# Altium footprint library BeaconBoard.PcbLib: 39 footprints (part 1 of 3)
Each footprint in its own frame and in the unit in brackets; x right, y up, seen from the top. Pads: shape width x height; smd on the part's side, far side on the other; paste and mask are expansions set on the pad; w line width, h text height; cw(c..) or ccw(c..) is an arc to the next point about the centre after c.
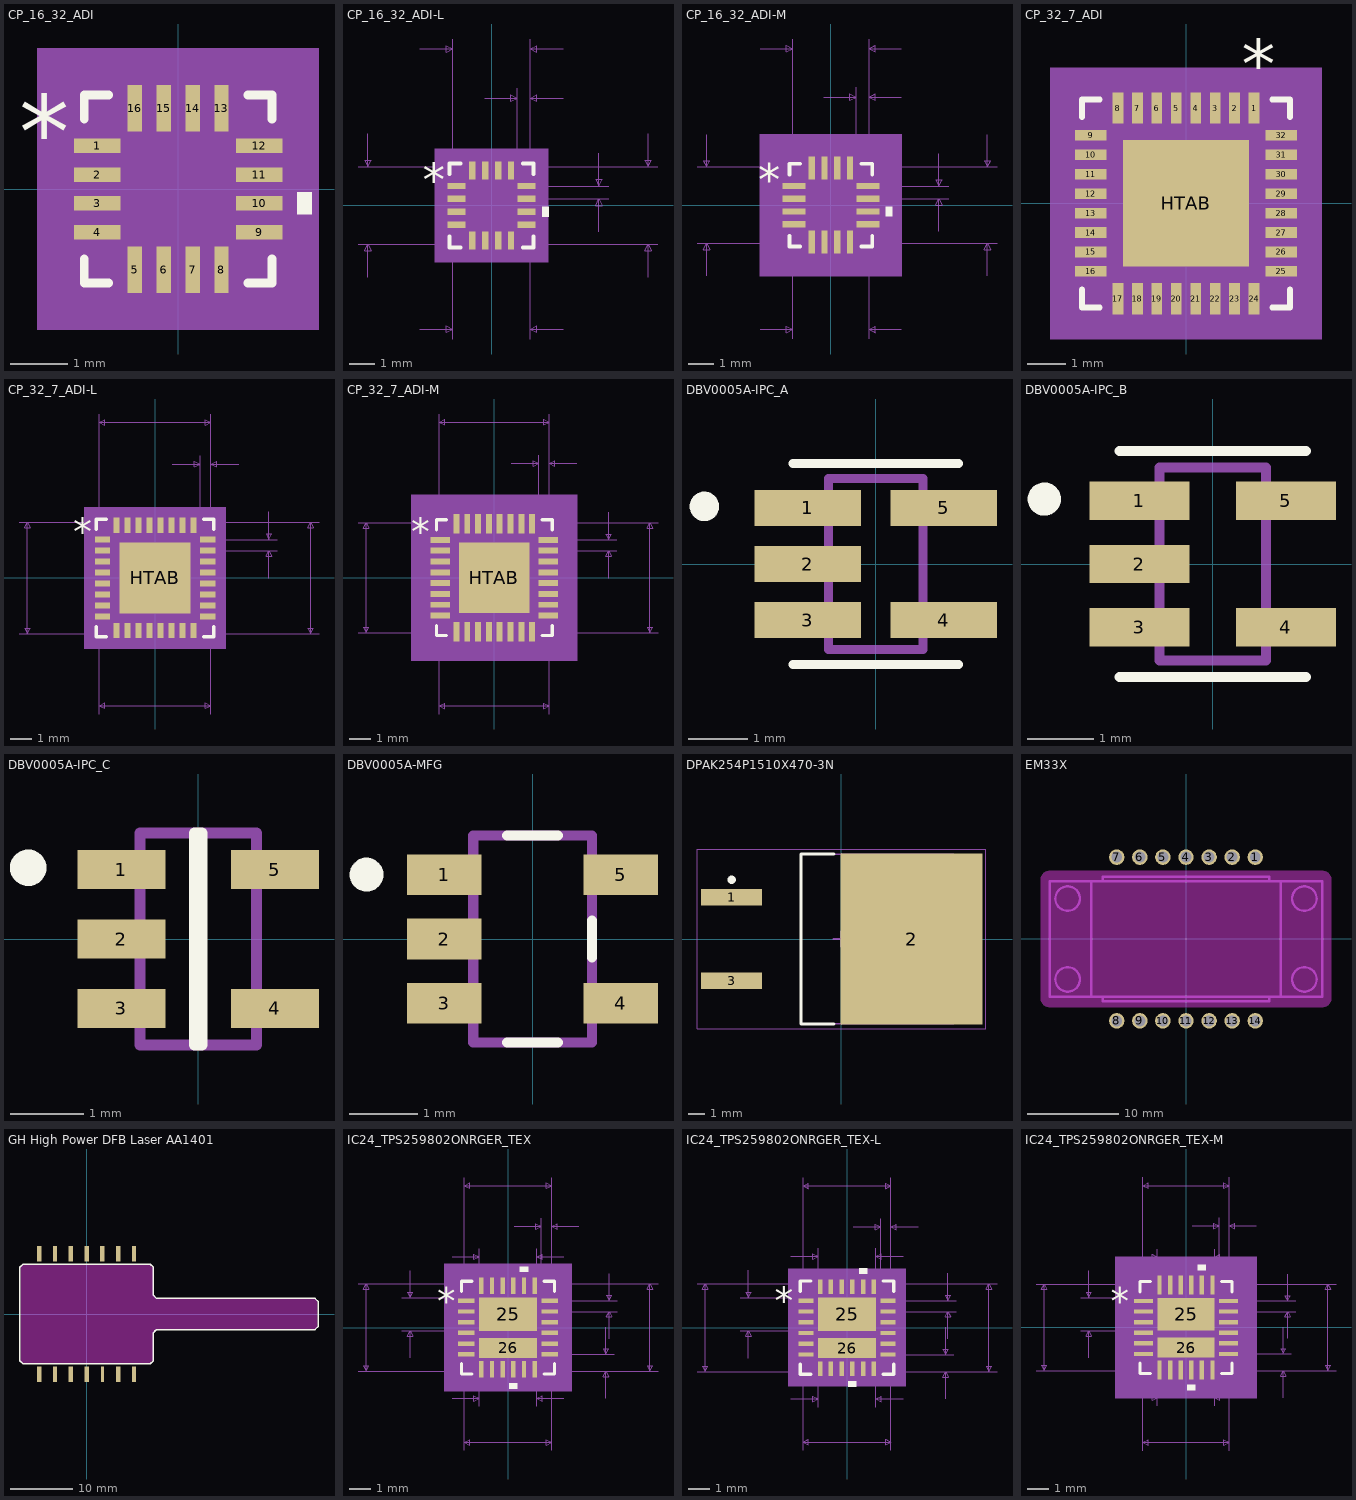
[diagram p0: the footprints below, top view; thin cyan lines are the x and y axes]

## CP_16_32_ADI [mm]
pads (16):
  rect 0.805x0.249 smd paste+0 mask+0: 1(-1.402,0.75) 2(-1.402,0.25) 3(-1.402,-0.25) 4(-1.402,-0.75) 9(1.402,-0.75) 10(1.402,-0.25) 11(1.402,0.25) 12(1.402,0.75)
  rect 0.249x0.805 smd paste+0 mask+0: 5(-0.75,-1.402) 6(-0.25,-1.402) 7(0.25,-1.402) 8(0.75,-1.402) 13(0.75,1.402) 14(0.25,1.402) 15(-0.25,1.402) 16(-0.75,1.402)
Top Overlay:
  region: 2.059,-0.059 2.313,-0.059 2.313,-0.44 2.059,-0.44
  lines w0.152: -1.627,-1.207 -1.627,-1.627 -1.207,-1.627 ; -1.627,1.207 -1.627,1.627 -1.207,1.627 ; 1.207,-1.627 1.627,-1.627 1.627,-1.207 ; 1.207,1.627 1.627,1.627 1.627,1.207
  text "*" at -2.757,0.365 h1.27
Mechanical 5:
  region: 2.44,-2.44 -2.44,-2.44 -2.44,2.44 2.44,2.44
Mechanical 13:
  lines w0.025: -1.5,0.23 -0.23,1.5 ; -1.5,-1.5 1.5,-1.5 1.5,1.5 -1.5,1.5 -1.5,-1.5 ; -1.5,-0.9 -1.5,-0.6 -1.5,-0.9 ; -1.5,-0.4 -1.5,-0.1 -1.5,-0.4 ; -1.5,0.1 -1.5,0.4 -1.5,0.1 ; -1.5,0.6 -1.5,0.9 -1.5,0.6 ; -0.9,-1.5 -0.6,-1.5 -0.9,-1.5 ; -0.9,1.5 -0.6,1.5 -0.9,1.5 ; -0.4,-1.5 -0.1,-1.5 -0.4,-1.5 ; -0.4,1.5 -0.1,1.5 -0.4,1.5 ; 0.1,-1.5 0.4,-1.5 0.1,-1.5 ; 0.1,1.5 0.4,1.5 0.1,1.5 ; 0.6,-1.5 0.9,-1.5 0.6,-1.5 ; 0.6,1.5 0.9,1.5 0.6,1.5 ; 1.5,-0.9 1.5,-0.6 1.5,-0.9 ; 1.5,-0.4 1.5,-0.1 1.5,-0.4 ; 1.5,0.1 1.5,0.4 1.5,0.1 ; 1.5,0.6 1.5,0.9 1.5,0.6
  text "*" at -1.318,0.365 h1.27
Mechanical 15:
  region: -1.129,-1.754 -1.754,-1.754 -1.754,-1.129 -2.059,-1.129 -2.059,1.129 -1.754,1.129 -1.754,1.754 -1.129,1.754 -1.129,2.059 1.129,2.059 1.129,1.754 1.754,1.754 1.754,1.129 2.059,1.129 2.059,-1.129 1.754,-1.129 1.754,-1.754 1.129,-1.754 1.129,-2.059 -1.129,-2.059
  lines w0.152: -2.059,-1.129 -1.754,-1.129 -1.754,-1.754 -1.129,-1.754 -1.129,-2.059 1.129,-2.059 1.129,-1.754 1.754,-1.754 1.754,-1.129 2.059,-1.129 2.059,1.129 1.754,1.129 1.754,1.754 1.129,1.754 1.129,2.059 -1.129,2.059 -1.129,1.754 -1.754,1.754 -1.754,1.129 -2.059,1.129 -2.059,-1.129
3D body: height 0.25, standoff 0, extent 0,0 0.254,0.254
3D body "CP_16_32_ADI.step": height 0.89, standoff 0, extent -1.5,-1.5 1.5,1.5

## CP_16_32_ADI-L [mm]
pads (16):
  rect 0.703x0.249 smd paste+0 mask+0: 1(-1.352,0.75) 2(-1.352,0.25) 3(-1.352,-0.25) 4(-1.352,-0.75) 9(1.352,-0.75) 10(1.352,-0.25) 11(1.352,0.25) 12(1.352,0.75)
  rect 0.249x0.703 smd paste+0 mask+0: 5(-0.75,-1.352) 6(-0.25,-1.352) 7(0.25,-1.352) 8(0.75,-1.352) 13(0.75,1.352) 14(0.25,1.352) 15(-0.25,1.352) 16(-0.75,1.352)
Top Overlay:
  region: 1.957,-0.059 2.211,-0.059 2.211,-0.44 1.957,-0.44
  lines w0.152: -1.627,-1.207 -1.627,-1.627 -1.207,-1.627 ; -1.627,1.207 -1.627,1.627 -1.207,1.627 ; 1.207,-1.627 1.627,-1.627 1.627,-1.207 ; 1.207,1.627 1.627,1.627 1.627,1.207
  text "*" at -2.656,0.365 h1.27
Mechanical 5:
  region: 2.186,-2.186 -2.186,-2.186 -2.186,2.186 2.186,2.186
Mechanical 7:
  lines w0.025: -5.158,-1.5 1.5,-1.5 ; -5.158,1.5 1.5,1.5 1.5,-5.158 ; -4.777,-2.77 -4.777,-1.5 ; -4.777,2.77 -4.777,1.5 ; -2.77,-4.777 -1.5,-4.777 ; -2.77,6.047 -1.5,6.047 ; -1.5,-5.158 -1.5,1.5 ; -1.5,0.75 -1.5,6.428 ; -0.27,4.142 1,4.142 ; 0.75,-1.5 6.428,-1.5 ; 0.75,1.5 6.428,1.5 ; 1,0.75 1,4.523 ; 1.352,0.25 4.523,0.25 ; 1.352,0.75 4.523,0.75 ; 1.5,4.523 1.5,0.75 1.5,6.428 ; 2.77,-4.777 1.5,-4.777 ; 2.77,4.142 1.5,4.142 ; 2.77,6.047 1.5,6.047 ; 4.142,-1.02 4.142,0.25 ; 4.142,2.02 4.142,0.75 ; 6.047,-2.77 6.047,-1.5 ; 6.047,2.77 6.047,1.5 ; -4.777,-1.5 -4.904,-1.754 -4.65,-1.754 -4.777,-1.5 ; -4.777,1.5 -4.904,1.754 -4.65,1.754 -4.777,1.5 ; -1.5,-4.777 -1.754,-4.65 -1.754,-4.904 -1.5,-4.777 ; -1.5,6.047 -1.754,6.174 -1.754,5.92 -1.5,6.047 ; 1,4.142 0.746,4.269 0.746,4.015 1,4.142 ; 1.5,-4.777 1.754,-4.65 1.754,-4.904 1.5,-4.777 ; 1.5,4.142 1.754,4.269 1.754,4.015 1.5,4.142 ; 1.5,6.047 1.754,6.174 1.754,5.92 1.5,6.047 ; 4.142,0.25 4.015,-0.004 4.269,-0.004 4.142,0.25 ; 4.142,0.75 4.015,1.004 4.269,1.004 4.142,0.75 ; 6.047,-1.5 5.92,-1.754 6.174,-1.754 6.047,-1.5 ; 6.047,1.5 5.92,1.754 6.174,1.754 6.047,1.5
  text "Default Padstyle: RX9p81Y27p69D0T" at -10.477,-9.577 h1.27
  text "Alt 1 Padstyle: OX60Y90D30P" at -8.572,-14.149 h1.27
  text "Alt 2 Padstyle: OX90Y60D30P" at -8.572,-15.673 h1.27
  text "0.02in/0.5mm" at 4.65,0.182 h0.64
  text "0.02in/0.5mm" at -0.655,4.65 h0.64
  text "0.118in/3mm" at -1.746,6.555 h0.64
  text "0.118in/3mm" at 6.555,-0.318 h0.64
  text "0.118in/3mm" at -8.777,-0.318 h0.64
  text "0.118in/3mm" at -1.746,-5.92 h0.64
Mechanical 13:
  lines w0.025: -1.5,0.23 -0.23,1.5 ; -1.5,-1.5 1.5,-1.5 1.5,1.5 -1.5,1.5 -1.5,-1.5 ; -1.5,-0.9 -1.5,-0.6 -1.5,-0.9 ; -1.5,-0.4 -1.5,-0.1 -1.5,-0.4 ; -1.5,0.1 -1.5,0.4 -1.5,0.1 ; -1.5,0.6 -1.5,0.9 -1.5,0.6 ; -0.9,-1.5 -0.6,-1.5 -0.9,-1.5 ; -0.9,1.5 -0.6,1.5 -0.9,1.5 ; -0.4,-1.5 -0.1,-1.5 -0.4,-1.5 ; -0.4,1.5 -0.1,1.5 -0.4,1.5 ; 0.1,-1.5 0.4,-1.5 0.1,-1.5 ; 0.1,1.5 0.4,1.5 0.1,1.5 ; 0.6,-1.5 0.9,-1.5 0.6,-1.5 ; 0.6,1.5 0.9,1.5 0.6,1.5 ; 1.5,-0.9 1.5,-0.6 1.5,-0.9 ; 1.5,-0.4 1.5,-0.1 1.5,-0.4 ; 1.5,0.1 1.5,0.4 1.5,0.1 ; 1.5,0.6 1.5,0.9 1.5,0.6
  text "*" at -1.318,0.365 h1.27
Mechanical 15:
  region: -0.976,-1.602 -1.602,-1.602 -1.602,-0.976 -1.805,-0.976 -1.805,0.976 -1.602,0.976 -1.602,1.602 -0.976,1.602 -0.976,1.805 0.976,1.805 0.976,1.602 1.602,1.602 1.602,0.976 1.805,0.976 1.805,-0.976 1.602,-0.976 1.602,-1.602 0.976,-1.602 0.976,-1.805 -0.976,-1.805
  lines w0.152: -1.805,-0.976 -1.602,-0.976 -1.602,-1.602 -0.976,-1.602 -0.976,-1.805 0.976,-1.805 0.976,-1.602 1.602,-1.602 1.602,-0.976 1.805,-0.976 1.805,0.976 1.602,0.976 1.602,1.602 0.976,1.602 0.976,1.805 -0.976,1.805 -0.976,1.602 -1.602,1.602 -1.602,0.976 -1.805,0.976 -1.805,-0.976
3D body: height 0.25, standoff 0, extent 0,0 0.254,0.254
3D body "CP_16_32_ADI.step": height 0.89, standoff 0, extent -1.5,-1.5 1.5,1.5

## CP_16_32_ADI-M [mm]
pads (16):
  rect 0.906x0.249 smd paste+0 mask+0: 1(-1.453,0.75) 2(-1.453,0.25) 3(-1.453,-0.25) 4(-1.453,-0.75) 9(1.453,-0.75) 10(1.453,-0.25) 11(1.453,0.25) 12(1.453,0.75)
  rect 0.249x0.906 smd paste+0 mask+0: 5(-0.75,-1.453) 6(-0.25,-1.453) 7(0.25,-1.453) 8(0.75,-1.453) 13(0.75,1.453) 14(0.25,1.453) 15(-0.25,1.453) 16(-0.75,1.453)
Top Overlay:
  region: 2.16,-0.059 2.414,-0.059 2.414,-0.44 2.16,-0.44
  lines w0.152: -1.627,-1.207 -1.627,-1.627 -1.207,-1.627 ; -1.627,1.207 -1.627,1.627 -1.207,1.627 ; 1.207,-1.627 1.627,-1.627 1.627,-1.207 ; 1.207,1.627 1.627,1.627 1.627,1.207
  text "*" at -2.859,0.365 h1.27
Mechanical 5:
  region: 2.795,-2.795 -2.795,-2.795 -2.795,2.795 2.795,2.795
Mechanical 7:
  lines w0.025: -5.259,-1.5 1.5,-1.5 ; -5.259,1.5 1.5,1.5 1.5,-5.259 ; -4.878,-2.77 -4.878,-1.5 ; -4.878,2.77 -4.878,1.5 ; -2.77,-4.878 -1.5,-4.878 ; -2.77,6.148 -1.5,6.148 ; -1.5,-5.259 -1.5,1.5 ; -1.5,0.75 -1.5,6.529 ; -0.27,4.243 1,4.243 ; 0.75,-1.5 6.529,-1.5 ; 0.75,1.5 6.529,1.5 ; 1,0.75 1,4.624 ; 1.453,0.25 4.624,0.25 ; 1.453,0.75 4.624,0.75 ; 1.5,4.624 1.5,0.75 1.5,6.529 ; 2.77,-4.878 1.5,-4.878 ; 2.77,4.243 1.5,4.243 ; 2.77,6.148 1.5,6.148 ; 4.243,-1.02 4.243,0.25 ; 4.243,2.02 4.243,0.75 ; 6.148,-2.77 6.148,-1.5 ; 6.148,2.77 6.148,1.5 ; -4.878,-1.5 -5.005,-1.754 -4.751,-1.754 -4.878,-1.5 ; -4.878,1.5 -5.005,1.754 -4.751,1.754 -4.878,1.5 ; -1.5,-4.878 -1.754,-4.751 -1.754,-5.005 -1.5,-4.878 ; -1.5,6.148 -1.754,6.275 -1.754,6.021 -1.5,6.148 ; 1,4.243 0.746,4.37 0.746,4.116 1,4.243 ; 1.5,-4.878 1.754,-4.751 1.754,-5.005 1.5,-4.878 ; 1.5,4.243 1.754,4.37 1.754,4.116 1.5,4.243 ; 1.5,6.148 1.754,6.275 1.754,6.021 1.5,6.148 ; 4.243,0.25 4.116,-0.004 4.37,-0.004 4.243,0.25 ; 4.243,0.75 4.116,1.004 4.37,1.004 4.243,0.75 ; 6.148,-1.5 6.021,-1.754 6.275,-1.754 6.148,-1.5 ; 6.148,1.5 6.021,1.754 6.275,1.754 6.148,1.5
  text "Default Padstyle: RX9p81Y35p69D0T" at -10.477,-9.78 h1.27
  text "Alt 1 Padstyle: OX60Y90D30P" at -8.572,-14.352 h1.27
  text "Alt 2 Padstyle: OX90Y60D30P" at -8.572,-15.876 h1.27
  text "0.02in/0.5mm" at 4.751,0.182 h0.64
  text "0.02in/0.5mm" at -0.655,4.751 h0.64
  text "0.118in/3mm" at -1.746,6.656 h0.64
  text "0.118in/3mm" at 6.656,-0.318 h0.64
  text "0.118in/3mm" at -8.879,-0.318 h0.64
  text "0.118in/3mm" at -1.746,-6.021 h0.64
Mechanical 13:
  lines w0.025: -1.5,0.23 -0.23,1.5 ; -1.5,-1.5 1.5,-1.5 1.5,1.5 -1.5,1.5 -1.5,-1.5 ; -1.5,-0.9 -1.5,-0.6 -1.5,-0.9 ; -1.5,-0.4 -1.5,-0.1 -1.5,-0.4 ; -1.5,0.1 -1.5,0.4 -1.5,0.1 ; -1.5,0.6 -1.5,0.9 -1.5,0.6 ; -0.9,-1.5 -0.6,-1.5 -0.9,-1.5 ; -0.9,1.5 -0.6,1.5 -0.9,1.5 ; -0.4,-1.5 -0.1,-1.5 -0.4,-1.5 ; -0.4,1.5 -0.1,1.5 -0.4,1.5 ; 0.1,-1.5 0.4,-1.5 0.1,-1.5 ; 0.1,1.5 0.4,1.5 0.1,1.5 ; 0.6,-1.5 0.9,-1.5 0.6,-1.5 ; 0.6,1.5 0.9,1.5 0.6,1.5 ; 1.5,-0.9 1.5,-0.6 1.5,-0.9 ; 1.5,-0.4 1.5,-0.1 1.5,-0.4 ; 1.5,0.1 1.5,0.4 1.5,0.1 ; 1.5,0.6 1.5,0.9 1.5,0.6
  text "*" at -1.318,0.365 h1.27
Mechanical 15:
  region: -1.383,-2.008 -2.008,-2.008 -2.008,-1.383 -2.414,-1.383 -2.414,1.383 -2.008,1.383 -2.008,2.008 -1.383,2.008 -1.383,2.414 1.383,2.414 1.383,2.008 2.008,2.008 2.008,1.383 2.414,1.383 2.414,-1.383 2.008,-1.383 2.008,-2.008 1.383,-2.008 1.383,-2.414 -1.383,-2.414
  lines w0.152: -2.414,-1.383 -2.008,-1.383 -2.008,-2.008 -1.383,-2.008 -1.383,-2.414 1.383,-2.414 1.383,-2.008 2.008,-2.008 2.008,-1.383 2.414,-1.383 2.414,1.383 2.008,1.383 2.008,2.008 1.383,2.008 1.383,2.414 -1.383,2.414 -1.383,2.008 -2.008,2.008 -2.008,1.383 -2.414,1.383 -2.414,-1.383
3D body "CP_16_32_ADI.step": height 0.89, standoff 0, extent -1.5,-1.5 1.5,1.5
3D body: height 0.25, standoff 0, extent 0,0 0.254,0.254

## CP_32_7_ADI [mm]
pads (33):
  rect 0.275x0.805 smd paste+0 mask+0: 1(1.75,2.452) 2(1.25,2.452) 3(0.75,2.452) 4(0.25,2.452) 5(-0.25,2.452) 6(-0.75,2.452) 7(-1.25,2.452) 8(-1.75,2.452) 17(-1.75,-2.452) 18(-1.25,-2.452) 19(-0.75,-2.452) 20(-0.25,-2.452) 21(0.25,-2.452) 22(0.75,-2.452) 23(1.25,-2.452) 24(1.75,-2.452)
  rect 0.805x0.275 smd paste+0 mask+0: 9(-2.452,1.75) 10(-2.452,1.25) 11(-2.452,0.75) 12(-2.452,0.25) 13(-2.452,-0.25) 14(-2.452,-0.75) 15(-2.452,-1.25) 16(-2.452,-1.75) 25(2.452,-1.75) 26(2.452,-1.25) 27(2.452,-0.75) 28(2.452,-0.25) 29(2.452,0.25) 30(2.452,0.75) 31(2.452,1.25) 32(2.452,1.75)
  rect 3.25x3.25 smd paste+0 mask+0: HTAB(0,0)
Top Overlay:
  lines w0.152: -2.677,-2.22 -2.677,-2.677 -2.22,-2.677 ; -2.677,2.22 -2.677,2.677 -2.22,2.677 ; 2.22,-2.677 2.677,-2.677 2.677,-2.22 ; 2.22,2.677 2.677,2.677 2.677,2.22
  text "*" at 1.432,2.96 h1.27
Top Paste:
  region: -0.1,1.525 -1.525,1.525 -1.525,0.1 -0.1,0.1
  region: -0.1,-0.1 -1.525,-0.1 -1.525,-1.525 -0.1,-1.525
  region: 1.525,1.525 0.1,1.525 0.1,0.1 1.525,0.1
  region: 1.525,-0.1 0.1,-0.1 0.1,-1.525 1.525,-1.525
Mechanical 5:
  region: 3.49,-3.49 -3.49,-3.49 -3.49,3.49 3.49,3.49
Mechanical 13:
  lines w0.025: -2.55,-2.55 2.55,-2.55 2.55,2.55 -2.55,2.55 -2.55,-2.55 ; -2.55,-1.9 -2.55,-1.6 -2.55,-1.9 ; -2.55,-1.4 -2.55,-1.1 -2.55,-1.4 ; -2.55,-0.9 -2.55,-0.6 -2.55,-0.9 ; -2.55,-0.4 -2.55,-0.1 -2.55,-0.4 ; -2.55,0.1 -2.55,0.4 -2.55,0.1 ; -2.55,0.6 -2.55,0.9 -2.55,0.6 ; -2.55,1.1 -2.55,1.4 -2.55,1.1 ; -2.55,1.6 -2.55,1.9 -2.55,1.6 ; -1.9,-2.55 -1.6,-2.55 -1.9,-2.55 ; -1.9,2.55 -1.6,2.55 -1.9,2.55 ; -1.4,-2.55 -1.1,-2.55 -1.4,-2.55 ; -1.4,2.55 -1.1,2.55 -1.4,2.55 ; -0.9,-2.55 -0.6,-2.55 -0.9,-2.55 ; -0.9,2.55 -0.6,2.55 -0.9,2.55 ; -0.4,-2.55 -0.1,-2.55 -0.4,-2.55 ; -0.4,2.55 -0.1,2.55 -0.4,2.55 ; 0.1,-2.55 0.4,-2.55 0.1,-2.55 ; 0.1,2.55 0.4,2.55 0.1,2.55 ; 0.6,-2.55 0.9,-2.55 0.6,-2.55 ; 0.6,2.55 0.9,2.55 0.6,2.55 ; 1.1,-2.55 1.4,-2.55 1.1,-2.55 ; 1.1,2.55 1.4,2.55 1.1,2.55 ; 1.6,-2.55 1.9,-2.55 1.6,-2.55 ; 1.6,2.55 1.9,2.55 1.6,2.55 ; 2.55,-1.9 2.55,-1.6 2.55,-1.9 ; 2.55,-1.4 2.55,-1.1 2.55,-1.4 ; 2.55,-0.9 2.55,-0.6 2.55,-0.9 ; 2.55,-0.4 2.55,-0.1 2.55,-0.4 ; 2.55,0.1 2.55,0.4 2.55,0.1 ; 2.55,0.6 2.55,0.9 2.55,0.6 ; 2.55,1.1 2.55,1.4 2.55,1.1 ; 2.55,1.6 2.55,1.9 2.55,1.6
  text "*" at 1.591,1.983 h0.64
Mechanical 15:
  region: -2.141,-2.804 -2.804,-2.804 -2.804,-2.141 -3.109,-2.141 -3.109,2.141 -2.804,2.141 -2.804,2.804 -2.141,2.804 -2.141,3.109 2.141,3.109 2.141,2.804 2.804,2.804 2.804,2.141 3.109,2.141 3.109,-2.141 2.804,-2.141 2.804,-2.804 2.141,-2.804 2.141,-3.109 -2.141,-3.109
  lines w0.152: -3.109,-2.141 -2.804,-2.141 -2.804,-2.804 -2.141,-2.804 -2.141,-3.109 2.141,-3.109 2.141,-2.804 2.804,-2.804 2.804,-2.141 3.109,-2.141 3.109,2.141 2.804,2.141 2.804,2.804 2.141,2.804 2.141,3.109 -2.141,3.109 -2.141,2.804 -2.804,2.804 -2.804,2.141 -3.109,2.141 -3.109,-2.141
3D body "CP_32_7_ADI.step": height 0.8, standoff 0, extent -2.55,-2.55 2.55,2.55
3D body: height 0.25, standoff 0, extent 0,0 0.254,0.254

## CP_32_7_ADI-L [mm]
pads (33):
  rect 0.275x0.7 smd paste+0 mask+0: 1(1.75,2.4) 2(1.25,2.4) 3(0.75,2.4) 4(0.25,2.4) 5(-0.25,2.4) 6(-0.75,2.4) 7(-1.25,2.4) 8(-1.75,2.4) 17(-1.75,-2.4) 18(-1.25,-2.4) 19(-0.75,-2.4) 20(-0.25,-2.4) 21(0.25,-2.4) 22(0.75,-2.4) 23(1.25,-2.4) 24(1.75,-2.4)
  rect 0.7x0.275 smd paste+0 mask+0: 9(-2.4,1.75) 10(-2.4,1.25) 11(-2.4,0.75) 12(-2.4,0.25) 13(-2.4,-0.25) 14(-2.4,-0.75) 15(-2.4,-1.25) 16(-2.4,-1.75) 25(2.4,-1.75) 26(2.4,-1.25) 27(2.4,-0.75) 28(2.4,-0.25) 29(2.4,0.25) 30(2.4,0.75) 31(2.4,1.25) 32(2.4,1.75)
  rect 3.25x3.25 smd paste+0 mask+0: HTAB(0,0)
Top Overlay:
  lines w0.152: -2.677,-2.22 -2.677,-2.677 -2.22,-2.677 ; -2.677,2.22 -2.677,2.677 -2.22,2.677 ; 2.22,-2.677 2.677,-2.677 2.677,-2.22 ; 2.22,2.677 2.677,2.677 2.677,2.22
  text "*" at -3.734,1.496 h1.27
Top Paste:
  region: 1.525,-0.1 0.1,-0.1 0.1,-1.525 1.525,-1.525
  region: 1.525,1.525 0.1,1.525 0.1,0.1 1.525,0.1
  region: -0.1,-0.1 -1.525,-0.1 -1.525,-1.525 -0.1,-1.525
  region: -0.1,1.525 -1.525,1.525 -1.525,0.1 -0.1,0.1
Mechanical 5:
  region: 3.233,-3.233 -3.233,-3.233 -3.233,3.233 3.233,3.233
Mechanical 7:
  lines w0.025: -6.206,-2.55 2.55,-2.55 ; -6.206,2.55 2.55,2.55 2.55,-6.206 ; -2.55,-6.206 -2.55,2.55 ; -2.55,1.75 -2.55,7.476 ; 0.78,5.19 2.05,5.19 ; 1.75,-2.55 7.476,-2.55 ; 1.75,2.55 7.476,2.55 ; 2.05,1.75 2.05,5.571 ; 2.4,1.25 5.571,1.25 ; 2.4,1.75 5.571,1.75 ; 2.55,5.571 2.55,1.75 2.55,7.476 ; 3.82,5.19 2.55,5.19 ; 5.19,-0.02 5.19,1.25 ; 5.19,3.02 5.19,1.75 ; -5.825,-2.55 -5.698,-2.296 -5.952,-2.296 -5.825,-2.55 ; -5.825,-2.55 -5.825,2.55 ; -5.825,2.55 -5.698,2.296 -5.952,2.296 -5.825,2.55 ; -2.55,-5.825 -2.296,-5.952 -2.296,-5.698 -2.55,-5.825 ; -2.55,-5.825 2.55,-5.825 ; -2.55,7.095 -2.296,6.968 -2.296,7.222 -2.55,7.095 ; -2.55,7.095 2.55,7.095 ; 2.05,5.19 1.796,5.063 1.796,5.317 2.05,5.19 ; 2.55,-5.825 2.296,-5.952 2.296,-5.698 2.55,-5.825 ; 2.55,5.19 2.804,5.063 2.804,5.317 2.55,5.19 ; 2.55,7.095 2.296,6.968 2.296,7.222 2.55,7.095 ; 5.19,1.25 5.317,0.996 5.063,0.996 5.19,1.25 ; 5.19,1.75 5.317,2.004 5.063,2.004 5.19,1.75 ; 7.095,-2.55 7.222,-2.296 6.968,-2.296 7.095,-2.55 ; 7.095,-2.55 7.095,2.55 ; 7.095,2.55 7.222,2.296 6.968,2.296 7.095,2.55
  text "0.201in/5.1mm" at -2.064,-6.968 h0.64
  text "0.201in/5.1mm" at -10.46,-0.318 h0.64
  text "0.201in/5.1mm" at 7.603,-0.318 h0.64
  text "0.201in/5.1mm" at -2.064,7.603 h0.64
  text "0.02in/0.5mm" at 0.395,5.698 h0.64
  text "0.02in/0.5mm" at 5.698,1.182 h0.64
  text "Alt 2 Padstyle: b229_152h76" at -8.572,-15.096 h1.27
  text "Alt 1 Padstyle: b152_229h76" at -8.572,-13.572 h1.27
  text "Heat Tab Padstyle: r325_325" at -8.572,-10.524 h1.27
  text "Default Padstyle: r27_70" at -7.62,-9 h1.27
Mechanical 13:
  lines w0.025: -2.55,-2.55 -2.55,2.55 2.55,2.55 2.55,-2.55 -2.55,-2.55 ; -2.55,-1.9 -2.55,-1.6 -2.55,-1.9 ; -2.55,-1.4 -2.55,-1.1 -2.55,-1.4 ; -2.55,-0.9 -2.55,-0.6 -2.55,-0.9 ; -2.55,-0.4 -2.55,-0.1 -2.55,-0.4 ; -2.55,0.1 -2.55,0.4 -2.55,0.1 ; -2.55,0.6 -2.55,0.9 -2.55,0.6 ; -2.55,1.1 -2.55,1.4 -2.55,1.1 ; -2.55,1.6 -2.55,1.9 -2.55,1.6 ; -1.9,-2.55 -1.6,-2.55 -1.9,-2.55 ; -1.9,2.55 -1.6,2.55 -1.9,2.55 ; -1.4,-2.55 -1.1,-2.55 -1.4,-2.55 ; -1.4,2.55 -1.1,2.55 -1.4,2.55 ; -0.9,-2.55 -0.6,-2.55 -0.9,-2.55 ; -0.9,2.55 -0.6,2.55 -0.9,2.55 ; -0.4,-2.55 -0.1,-2.55 -0.4,-2.55 ; -0.4,2.55 -0.1,2.55 -0.4,2.55 ; 0.1,-2.55 0.4,-2.55 0.1,-2.55 ; 0.1,2.55 0.4,2.55 0.1,2.55 ; 0.6,-2.55 0.9,-2.55 0.6,-2.55 ; 0.6,2.55 0.9,2.55 0.6,2.55 ; 1.1,-2.55 1.4,-2.55 1.1,-2.55 ; 1.1,2.55 1.4,2.55 1.1,2.55 ; 1.6,-2.55 1.9,-2.55 1.6,-2.55 ; 1.6,2.55 1.9,2.55 1.6,2.55 ; 2.55,-1.9 2.55,-1.6 2.55,-1.9 ; 2.55,-1.4 2.55,-1.1 2.55,-1.4 ; 2.55,-0.9 2.55,-0.6 2.55,-0.9 ; 2.55,-0.4 2.55,-0.1 2.55,-0.4 ; 2.55,0.1 2.55,0.4 2.55,0.1 ; 2.55,0.6 2.55,0.9 2.55,0.6 ; 2.55,1.1 2.55,1.4 2.55,1.1 ; 2.55,1.6 2.55,1.9 2.55,1.6
  text "*" at -2.305,1.585 h0.64
Mechanical 15:
  region: -1.989,-2.652 -2.652,-2.652 -2.652,-1.989 -2.852,-1.989 -2.852,1.989 -2.652,1.989 -2.652,2.652 -1.989,2.652 -1.989,2.852 1.989,2.852 1.989,2.652 2.652,2.652 2.652,1.989 2.852,1.989 2.852,-1.989 2.652,-1.989 2.652,-2.652 1.989,-2.652 1.989,-2.852 -1.989,-2.852
  lines w0.152: -2.852,-1.989 -2.852,1.989 -2.652,1.989 -2.652,2.652 -1.989,2.652 -1.989,2.852 1.989,2.852 1.989,2.652 2.652,2.652 2.652,1.989 2.852,1.989 2.852,-1.989 2.652,-1.989 2.652,-2.652 1.989,-2.652 1.989,-2.852 -1.989,-2.852 -1.989,-2.652 -2.652,-2.652 -2.652,-1.989 -2.852,-1.989
3D body "CP_32_7_ADI.step": height 0.8, standoff 0, extent -2.55,-2.55 2.55,2.55
3D body: height 0.25, standoff 0, extent 0,0 0.254,0.254

## CP_32_7_ADI-M [mm]
pads (33):
  rect 0.275x0.9 smd paste+0 mask+0: 1(1.75,2.5) 2(1.25,2.5) 3(0.75,2.5) 4(0.25,2.5) 5(-0.25,2.5) 6(-0.75,2.5) 7(-1.25,2.5) 8(-1.75,2.5) 17(-1.75,-2.5) 18(-1.25,-2.5) 19(-0.75,-2.5) 20(-0.25,-2.5) 21(0.25,-2.5) 22(0.75,-2.5) 23(1.25,-2.5) 24(1.75,-2.5)
  rect 0.9x0.275 smd paste+0 mask+0: 9(-2.5,1.75) 10(-2.5,1.25) 11(-2.5,0.75) 12(-2.5,0.25) 13(-2.5,-0.25) 14(-2.5,-0.75) 15(-2.5,-1.25) 16(-2.5,-1.75) 25(2.5,-1.75) 26(2.5,-1.25) 27(2.5,-0.75) 28(2.5,-0.25) 29(2.5,0.25) 30(2.5,0.75) 31(2.5,1.25) 32(2.5,1.75)
  rect 3.25x3.25 smd paste+0 mask+0: HTAB(0,0)
Top Overlay:
  lines w0.152: -2.677,-2.22 -2.677,-2.677 -2.22,-2.677 ; -2.677,2.22 -2.677,2.677 -2.22,2.677 ; 2.22,-2.677 2.677,-2.677 2.677,-2.22 ; 2.22,2.677 2.677,2.677 2.677,2.22
  text "*" at -3.834,1.496 h1.27
Top Paste:
  region: 1.525,-0.1 0.1,-0.1 0.1,-1.525 1.525,-1.525
  region: 1.525,1.525 0.1,1.525 0.1,0.1 1.525,0.1
  region: -0.1,-0.1 -1.525,-0.1 -1.525,-1.525 -0.1,-1.525
  region: -0.1,1.525 -1.525,1.525 -1.525,0.1 -0.1,0.1
Mechanical 5:
  region: 3.839,-3.839 -3.839,-3.839 -3.839,3.839 3.839,3.839
Mechanical 7:
  lines w0.025: -6.306,-2.55 2.55,-2.55 ; -6.306,2.55 2.55,2.55 2.55,-6.306 ; -2.55,-6.306 -2.55,2.55 ; -2.55,1.75 -2.55,7.576 ; 0.78,5.29 2.05,5.29 ; 1.75,-2.55 7.576,-2.55 ; 1.75,2.55 7.576,2.55 ; 2.05,1.75 2.05,5.671 ; 2.5,1.25 5.671,1.25 ; 2.5,1.75 5.671,1.75 ; 2.55,5.671 2.55,1.75 2.55,7.576 ; 3.82,5.29 2.55,5.29 ; 5.29,-0.02 5.29,1.25 ; 5.29,3.02 5.29,1.75 ; -5.925,-2.55 -5.798,-2.296 -6.052,-2.296 -5.925,-2.55 ; -5.925,-2.55 -5.925,2.55 ; -5.925,2.55 -5.798,2.296 -6.052,2.296 -5.925,2.55 ; -2.55,-5.925 -2.296,-6.052 -2.296,-5.798 -2.55,-5.925 ; -2.55,-5.925 2.55,-5.925 ; -2.55,7.195 -2.296,7.068 -2.296,7.322 -2.55,7.195 ; -2.55,7.195 2.55,7.195 ; 2.05,5.29 1.796,5.163 1.796,5.417 2.05,5.29 ; 2.55,-5.925 2.296,-6.052 2.296,-5.798 2.55,-5.925 ; 2.55,5.29 2.804,5.163 2.804,5.417 2.55,5.29 ; 2.55,7.195 2.296,7.068 2.296,7.322 2.55,7.195 ; 5.29,1.25 5.417,0.996 5.163,0.996 5.29,1.25 ; 5.29,1.75 5.417,2.004 5.163,2.004 5.29,1.75 ; 7.195,-2.55 7.322,-2.296 7.068,-2.296 7.195,-2.55 ; 7.195,-2.55 7.195,2.55 ; 7.195,2.55 7.322,2.296 7.068,2.296 7.195,2.55
  text "0.201in/5.1mm" at -2.064,-7.068 h0.64
  text "0.201in/5.1mm" at -10.56,-0.318 h0.64
  text "0.201in/5.1mm" at 7.703,-0.318 h0.64
  text "0.201in/5.1mm" at -2.064,7.703 h0.64
  text "0.02in/0.5mm" at 0.395,5.798 h0.64
  text "0.02in/0.5mm" at 5.798,1.182 h0.64
  text "Alt 2 Padstyle: b229_152h76" at -8.572,-15.196 h1.27
  text "Alt 1 Padstyle: b152_229h76" at -8.572,-13.672 h1.27
  text "Heat Tab Padstyle: r325_325" at -8.572,-10.624 h1.27
  text "Default Padstyle: r27_90" at -7.62,-9.1 h1.27
Mechanical 13:
  lines w0.025: -2.55,-2.55 -2.55,2.55 2.55,2.55 2.55,-2.55 -2.55,-2.55 ; -2.55,-1.9 -2.55,-1.6 -2.55,-1.9 ; -2.55,-1.4 -2.55,-1.1 -2.55,-1.4 ; -2.55,-0.9 -2.55,-0.6 -2.55,-0.9 ; -2.55,-0.4 -2.55,-0.1 -2.55,-0.4 ; -2.55,0.1 -2.55,0.4 -2.55,0.1 ; -2.55,0.6 -2.55,0.9 -2.55,0.6 ; -2.55,1.1 -2.55,1.4 -2.55,1.1 ; -2.55,1.6 -2.55,1.9 -2.55,1.6 ; -1.9,-2.55 -1.6,-2.55 -1.9,-2.55 ; -1.9,2.55 -1.6,2.55 -1.9,2.55 ; -1.4,-2.55 -1.1,-2.55 -1.4,-2.55 ; -1.4,2.55 -1.1,2.55 -1.4,2.55 ; -0.9,-2.55 -0.6,-2.55 -0.9,-2.55 ; -0.9,2.55 -0.6,2.55 -0.9,2.55 ; -0.4,-2.55 -0.1,-2.55 -0.4,-2.55 ; -0.4,2.55 -0.1,2.55 -0.4,2.55 ; 0.1,-2.55 0.4,-2.55 0.1,-2.55 ; 0.1,2.55 0.4,2.55 0.1,2.55 ; 0.6,-2.55 0.9,-2.55 0.6,-2.55 ; 0.6,2.55 0.9,2.55 0.6,2.55 ; 1.1,-2.55 1.4,-2.55 1.1,-2.55 ; 1.1,2.55 1.4,2.55 1.1,2.55 ; 1.6,-2.55 1.9,-2.55 1.6,-2.55 ; 1.6,2.55 1.9,2.55 1.6,2.55 ; 2.55,-1.9 2.55,-1.6 2.55,-1.9 ; 2.55,-1.4 2.55,-1.1 2.55,-1.4 ; 2.55,-0.9 2.55,-0.6 2.55,-0.9 ; 2.55,-0.4 2.55,-0.1 2.55,-0.4 ; 2.55,0.1 2.55,0.4 2.55,0.1 ; 2.55,0.6 2.55,0.9 2.55,0.6 ; 2.55,1.1 2.55,1.4 2.55,1.1 ; 2.55,1.6 2.55,1.9 2.55,1.6